# Altium footprint library connector.PcbLib: 227 footprints (part 15 of 15)
Each footprint in its own frame and in the unit in brackets; x right, y up, seen from the top. Pads: shape width x height; smd on the part's side, far side on the other; paste and mask are expansions set on the pad; w line width, h text height; cw(c..) or ccw(c..) is an arc to the next point about the centre after c.
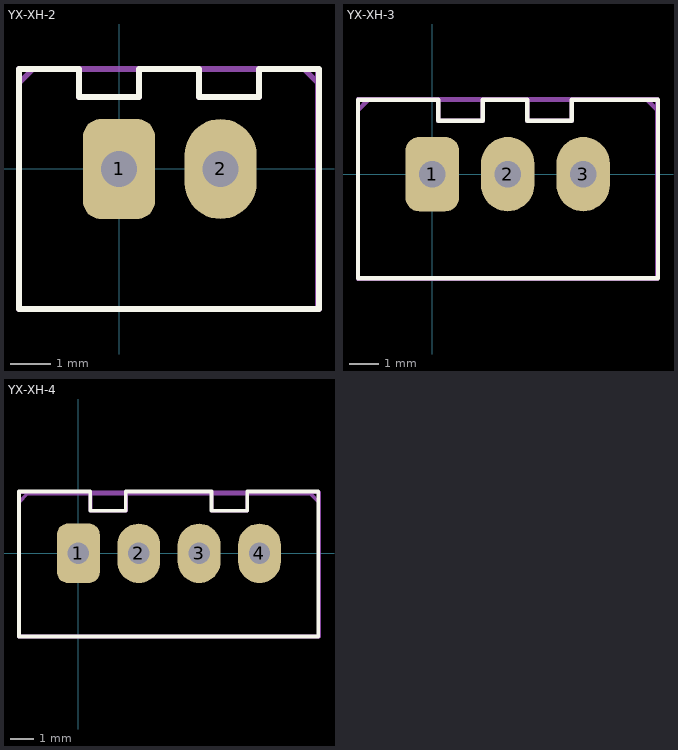
[diagram p14: the footprints below, top view; thin cyan lines are the x and y axes]

## YX-XH-2 [mm]
pads (2):
  rrect50% 1.8x2.5 hole 0.9: 1(0,0)
  oval 1.8x2.5 hole 0.9: 2(2.54,0)
Top Overlay:
  lines w0.15: -2.5,-3.5 -2.5,2.5 -1,2.5 -1,1.8 0.5,1.8 0.5,2.5 2,2.5 2,1.8 3.5,1.8 3.5,2.5 5,2.5 5,-3.5 -2.5,-3.5
Mechanical 29:
  lines w0.15: -1,2.5 -1,1.8 0.5,1.8 0.5,2.5 ; 2,2.5 2,1.8 3.5,1.8 3.5,2.5 ; -2.5,-3.5 5,-3.5 5,2.125 4.625,2.5 -2.15,2.5 -2.5,2.15 -2.5,-3.5 ; -2.5,-3.5 4.975,-3.5 4.975,2.5 -2.5,2.5 -2.5,-3.5
  text ".Designator" at -2,-0.8 h1
3D body "User Library-CWF-2.step": height 7, standoff -3.5, extent -2.46,-3.55 5.04,2.2

## YX-XH-3 [mm]
pads (3):
  rrect50% 1.8x2.5 hole 0.9: 1(0,0)
  oval 1.8x2.5 hole 0.9: 2(2.54,0) 3(5.08,0)
Top Overlay:
  lines w0.15: -2.5,-3.5 -2.5,2.5 0.2,2.5 0.2,1.8 1.7,1.8 1.7,2.5 3.2,2.5 3.2,1.8 4.7,1.8 4.7,2.5 7.6,2.5 7.6,-3.5 -2.5,-3.5
Mechanical 29:
  lines w0.15: -2.5,-2.1 -2.5,1.825 ; 0.2,2.5 0.2,1.8 1.7,1.8 1.7,2.5 ; 3.2,2.5 3.2,1.8 4.7,1.8 4.7,2.5 ; 7.575,2.525 -2.5,2.525 -2.5,-3.525 7.58,-3.525 7.58,2.525 ; 7.58,-2.1 7.58,1.825 ; -2.5,-3.5 -2.5,2.15 -2.15,2.5 7.23,2.5 7.58,2.15 7.58,-3.5 -2.5,-3.5
  text ".Designator" at -1,-1.3 h1
3D body "User Library-XH-3P_2_5_Silver.STEP": height 7, standoff -3.5, extent -2.4,-3.375 7.5,2.375

## YX-XH-4 [mm]
pads (4):
  rrect50% 1.8x2.5 hole 0.9: 1(0,0)
  oval 1.8x2.5 hole 0.9: 2(2.54,0) 3(5.08,0) 4(7.62,0)
Top Overlay:
  lines w0.15: -2.5,-3.5 -2.5,2.6 0.5,2.6 0.5,1.8 2,1.8 2,2.6 5.6,2.6 5.6,1.8 7.1,1.8 7.1,2.6 10.1,2.6 10.1,-3.5 -2.5,-3.5
Mechanical 29:
  lines w0.15: -2.5,-2.1 -2.5,1.825 ; 0.51,2.5 0.51,1.8 2.01,1.8 2.01,2.5 ; 5.61,2.5 5.61,1.8 7.11,1.8 7.11,2.5 ; 10.12,-2.1 10.12,1.825 ; -2.5,-3.5 10.125,-3.5 10.125,2.575 -2.5,2.575 -2.5,-3.5 ; -2.5,-3.5 -2.5,2.15 -2.15,2.5 9.77,2.5 10.12,2.15 10.12,-3.5 -2.5,-3.5
  text ".Designator" at 0,-2.3 h1
3D body "User Library-HEADER JST BxB-XH-A.step": height 7, standoff -3.4, extent -2.4,-3.4 10,2.35